# Altium footprint library Zmod.PcbLib: 229 footprints (part 8 of 15)
Each footprint in its own frame and in the unit in brackets; x right, y up, seen from the top. Pads: shape width x height; smd on the part's side, far side on the other; paste and mask are expansions set on the pad; w line width, h text height; cw(c..) or ccw(c..) is an arc to the next point about the centre after c.
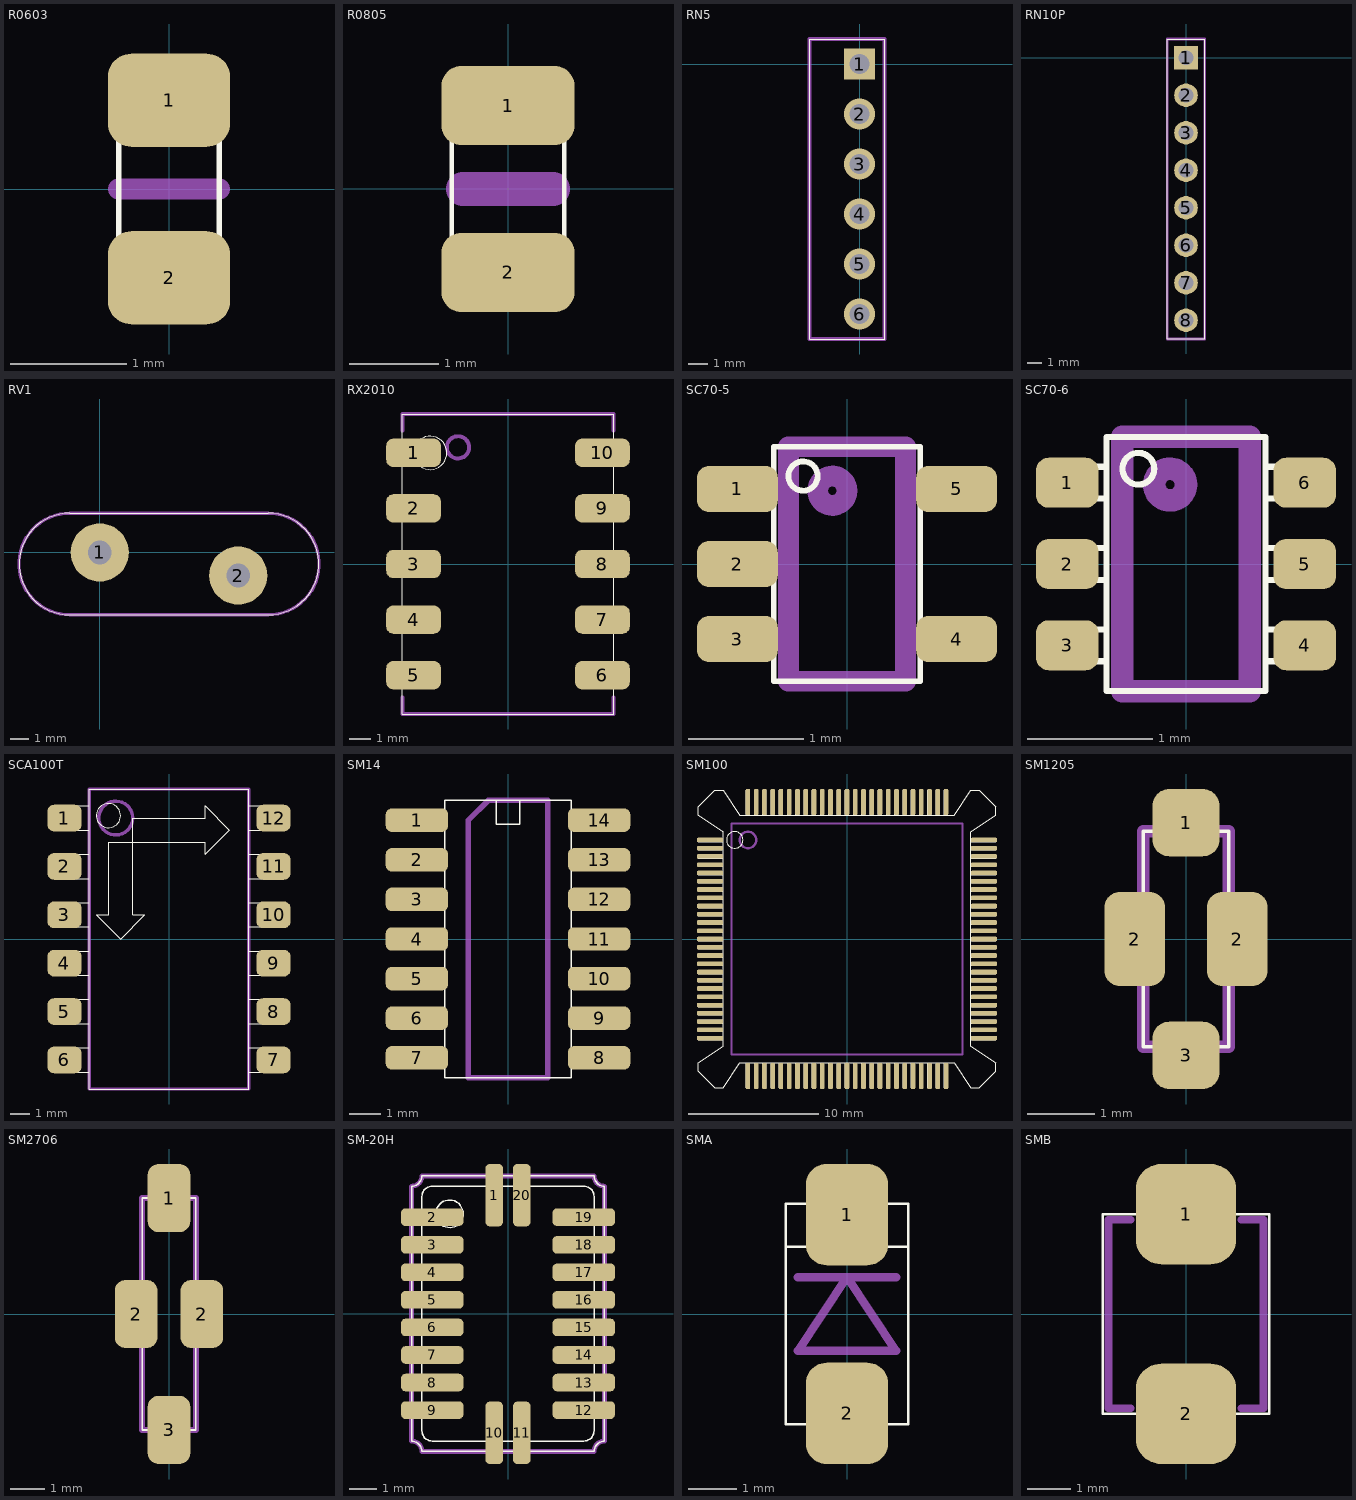
[diagram p7: the footprints below, top view; thin cyan lines are the x and y axes]

## R0603 [mm]
height 0.508
pads (2):
  rrect50% 1.05x0.8 smd: 1(0,0.762) 2(0,-0.762)
Top Overlay:
  lines w0.05: -0.432,-0.787 -0.432,0.787 0.432,0.787 0.432,-0.787 -0.432,-0.787
Mechanical 15:
  lines w0.18: -0.432,0 0.432,0
  text ".Designator" at 0.508,-1.397 h1.5

## R0805 [mm]
pads (2):
  rrect50% 1.5x0.89 smd: 1(0,0.94) 2(0,-0.94)
Top Overlay:
  lines w0.05: -0.635,-1.016 0.635,-1.016 0.635,1.016 -0.635,1.016 -0.635,-1.016
Mechanical 15:
  lines w0.38: -0.508,0 0.508,0
  text ".Designator" at 0.635,-1.905 h1.5

## RN5 [mm]
pads (6):
  rect 1.6x1.6 / inner round 1 / far side rect 1.6x1.6 hole 1: 1(0,0)
  round 1.6 / inner round 1 / far side round 1.6 hole 1: 2(0,-2.54) 3(0,-5.08) 4(0,-7.62) 5(0,-10.16) 6(0,-12.7)
Top Overlay:
  lines w0.05: -2.54,-13.97 -2.54,1.27 1.27,1.27 1.27,-13.97 -2.54,-13.97
Mechanical 15:
  lines w0.18: -2.54,-13.97 -2.54,1.27 1.27,1.27 1.27,-13.97 -2.54,-13.97
  text ".Designator" at -0.762,-14.097 h1.5

## RN10P [mm]
pads (8):
  rect 1.6x1.6 / inner round 1 / far side rect 1.6x1.6 hole 1: 1(0,0)
  round 1.6 / inner round 1 / far side round 1.6 hole 1: 2(0,-2.54) 3(0,-5.08) 4(0,-7.62) 5(0,-10.16) 6(0,-12.7) 7(0,-15.24) 8(0,-17.78)
Top Overlay:
  lines w0.05: -1.27,-19.05 -1.27,1.27 1.27,1.27 1.27,-19.05 -1.27,-19.05
Mechanical 15:
  lines w0.18: -1.27,-19.05 -1.27,1.27 1.27,1.27 1.27,-19.05 -1.27,-19.05
  text ".Designator" at 0.762,-19.05 h1.5

## RV1 [mm]
pads (2):
  round 3.2 / inner round 1.3 / far side round 3.2 hole 1.3: 1(0,0) 2(7.62,-1.27)
Top Overlay:
  lines w0.05: -1.651,-3.429 9.271,-3.429 ; -1.651,2.159 9.271,2.159 ; -1.646,-3.429 cw(c-1.651,-0.635) -1.646,2.159 ; 9.276,-3.429 ccw(c9.271,-0.635) 9.276,2.159
Mechanical 15:
  lines w0.18: -1.651,-3.429 9.271,-3.429 ; -1.651,2.159 9.271,2.159 ; -1.646,-3.429 cw(c-1.651,-0.635) -1.646,2.159 ; 9.276,-3.429 ccw(c9.271,-0.635) 9.276,2.159
  text ".Designator" at -0.889,0.508 h1.5

## RX2010 [mm]
height 2.54
pads (10):
  rrect50% 2.5x1.3 smd paste+0: 1(-4.318,5.08) 2(-4.318,2.54) 3(-4.318,0) 4(-4.318,-2.54) 5(-4.318,-5.08) 6(4.318,-5.08) 7(4.318,-2.54) 8(4.318,0) 9(4.318,2.54) 10(4.318,5.08)
Top Overlay:
  circle w0.05: c-3.556,5.08 r0.762
  lines w0.05: -4.826,-6.858 -4.826,6.858 4.826,6.858 4.826,-6.858 -4.826,-6.858
Mechanical 15:
  circle w0.18: c-2.286,5.334 r0.508
  lines w0.18: -4.826,-6.096 -4.826,-6.858 4.826,-6.858 4.826,-6.096 ; -4.826,6.096 -4.826,6.858 4.826,6.858 4.826,6.096
  text ".Designator" at -1.397,-5.969 h1.5

## SC70-5 [mm] "Rev. 2, pad size was 0.5x0.4mm, round"
height 2.413
pads (5):
  rrect50% 0.7x0.4 smd paste+0: 1(-0.95,0.65) 2(-0.95,0) 3(-0.95,-0.65) 4(0.95,-0.65) 5(0.95,0.65)
Top Overlay:
  circle w0.05: c-0.381,0.762 r0.127
  lines w0.05: -0.635,-0.777 -1.016,-0.777 -1.016,-0.523 -0.635,-0.523 ; -0.635,-0.127 -1.016,-0.127 -1.016,0.127 -0.635,0.127 ; -0.635,0.523 -1.016,0.523 -1.016,0.777 -0.635,0.777 ; 0.635,-0.777 1.016,-0.777 1.016,-0.523 0.635,-0.523 ; 0.635,0.523 1.016,0.523 1.016,0.777 0.635,0.777 ; -0.635,-1.016 -0.635,1.016 0.635,1.016 0.635,-1.016 -0.635,-1.016
Mechanical 15:
  circle w0.18: c-0.127,0.635 r0.127
  lines w0.18: -0.508,-1.016 -0.508,1.016 0.508,1.016 0.508,-1.016 -0.508,-1.016
  text ".Designator" at 0.127,-1.143 h1.5

## SC70-6 [mm]
height 2.413
pads (6):
  rrect50% 0.5x0.4 smd paste+0: 1(-0.95,0.65) 2(-0.95,0) 3(-0.95,-0.65) 4(0.95,-0.65) 5(0.95,0) 6(0.95,0.65)
Top Overlay:
  circle w0.05: c-0.381,0.762 r0.127
  lines w0.05: -0.635,-0.777 -1.016,-0.777 -1.016,-0.523 -0.635,-0.523 ; -0.635,-0.127 -1.016,-0.127 -1.016,0.127 -0.635,0.127 ; -0.635,0.523 -1.016,0.523 -1.016,0.777 -0.635,0.777 ; 0.635,-0.777 1.016,-0.777 1.016,-0.523 0.635,-0.523 ; 0.635,-0.127 1.016,-0.127 1.016,0.127 0.635,0.127 ; 0.635,0.523 1.016,0.523 1.016,0.777 0.635,0.777 ; -0.635,-1.016 0.635,-1.016 0.635,1.016 -0.635,1.016 -0.635,-1.016
Mechanical 15:
  circle w0.18: c-0.127,0.635 r0.127
  lines w0.18: -0.508,-1.016 0.508,-1.016 0.508,1.016 -0.508,1.016 -0.508,-1.016
  text ".Designator" at 0.127,-1.143 h1.5

## SCA100T [mm]
height 5.08
pads (12):
  rrect50% 1.8x1.4 smd paste+0: 1(-5.486,6.35) 2(-5.486,3.81) 3(-5.486,1.27) 4(-5.486,-1.27) 5(-5.486,-3.81) 6(-5.486,-6.35) 7(5.486,-6.35) 8(5.486,-3.81) 9(5.486,-1.27) 10(5.486,1.27) 11(5.486,3.81) 12(5.486,6.35)
Top Overlay:
  circle w0.05: c-3.175,6.477 r0.635
  lines w0.05: -4.953,-6.604 -5.715,-6.604 -5.715,-6.096 -4.953,-6.096 ; -4.953,-4.064 -5.715,-4.064 -5.715,-3.556 -4.953,-3.556 ; -4.953,-1.524 -5.715,-1.524 -5.715,-1.016 -4.953,-1.016 ; -4.953,1.016 -5.715,1.016 -5.715,1.524 -4.953,1.524 ; -4.953,3.556 -5.715,3.556 -5.715,4.064 -4.953,4.064 ; -4.953,6.096 -5.715,6.096 -5.715,6.604 -4.953,6.604 ; -4.191,-6.985 -4.953,-6.985 -4.953,-5.715 -4.191,-5.715 ; -4.191,-4.445 -4.953,-4.445 -4.953,-3.175 -4.191,-3.175 ; -4.191,-1.905 -4.953,-1.905 -4.953,-0.635 -4.191,-0.635 ; -4.191,0.635 -4.953,0.635 -4.953,1.905 -4.191,1.905 ; -4.191,3.175 -4.953,3.175 -4.953,4.445 -4.191,4.445 ; -4.191,5.715 -4.953,5.715 -4.953,6.985 -4.191,6.985 ; 4.191,-6.985 4.953,-6.985 4.953,-5.715 4.191,-5.715 ; 4.191,-4.445 4.953,-4.445 4.953,-3.175 4.191,-3.175 ; 4.191,-1.905 4.953,-1.905 4.953,-0.635 4.191,-0.635 ; 4.191,0.635 4.953,0.635 4.953,1.905 4.191,1.905 ; 4.191,3.175 4.953,3.175 4.953,4.445 4.191,4.445 ; 4.191,5.715 4.953,5.715 4.953,6.985 4.191,6.985 ; 4.953,-6.604 5.715,-6.604 5.715,-6.096 4.953,-6.096 ; 4.953,-4.064 5.715,-4.064 5.715,-3.556 4.953,-3.556 ; 4.953,-1.524 5.715,-1.524 5.715,-1.016 4.953,-1.016 ; 4.953,1.016 5.715,1.016 5.715,1.524 4.953,1.524 ; 4.953,3.556 5.715,3.556 5.715,4.064 4.953,4.064 ; 4.953,6.096 5.715,6.096 5.715,6.604 4.953,6.604 ; -1.905,5.08 -1.905,1.27 -1.27,1.27 -2.54,0 -3.81,1.27 -3.175,1.27 -3.175,5.08 -1.905,5.08 ; -1.905,5.08 -1.905,6.35 1.905,6.35 1.905,6.985 3.175,5.715 1.905,4.445 1.905,5.08 -1.905,5.08 ; -4.191,-7.874 -4.191,7.874 4.191,7.874 4.191,-7.874 -4.191,-7.874
Mechanical 15:
  circle w0.18: c-2.794,6.35 r0.889
  lines w0.18: -4.191,-7.874 -4.191,7.874 4.191,7.874 4.191,-7.874 -4.191,-7.874
  text ".Designator" at -1.524,-7.112 h1.5

## SM14 [mm]
height 1.905
pads (14):
  rrect50% 2x0.75 smd paste+0: 1(-2.921,3.81) 2(-2.921,2.54) 3(-2.921,1.27) 4(-2.921,0) 5(-2.921,-1.27) 6(-2.921,-2.54) 7(-2.921,-3.81) 8(2.921,-3.81) 9(2.921,-2.54) 10(2.921,-1.27) 11(2.921,0) 12(2.921,1.27) 13(2.921,2.54) 14(2.921,3.81)
Top Overlay:
  lines w0.05: -2.032,-4.064 -3.175,-4.064 -3.175,-3.556 -2.032,-3.556 ; -2.032,-2.794 -3.175,-2.794 -3.175,-2.286 -2.032,-2.286 ; -2.032,-1.524 -3.175,-1.524 -3.175,-1.016 -2.032,-1.016 ; -2.032,-0.254 -3.175,-0.254 -3.175,0.254 -2.032,0.254 ; -2.032,1.016 -3.175,1.016 -3.175,1.524 -2.032,1.524 ; -2.032,2.286 -3.175,2.286 -3.175,2.794 -2.032,2.794 ; -2.032,3.556 -3.175,3.556 -3.175,4.064 -2.032,4.064 ; -0.381,4.445 -0.381,3.683 0.381,3.683 0.381,4.445 ; 2.032,-4.064 3.175,-4.064 3.175,-3.556 2.032,-3.556 ; 2.032,-2.794 3.175,-2.794 3.175,-2.286 2.032,-2.286 ; 2.032,-1.524 3.175,-1.524 3.175,-1.016 2.032,-1.016 ; 2.032,-0.254 3.175,-0.254 3.175,0.254 2.032,0.254 ; 2.032,1.016 3.175,1.016 3.175,1.524 2.032,1.524 ; 2.032,2.286 3.175,2.286 3.175,2.794 2.032,2.794 ; 2.032,3.556 3.175,3.556 3.175,4.064 2.032,4.064 ; -2.032,-4.445 -2.032,4.445 2.032,4.445 2.032,-4.445 -2.032,-4.445
Mechanical 15:
  lines w0.18: -1.27,-4.445 1.27,-4.445 1.27,4.445 -0.635,4.445 -1.27,3.81 -1.27,-4.445
  text ".Designator" at -0.762,-4.064 h1.5

## SM100 [mm]
height 2.54
pads (100):
  rrect50% 2x0.35 smd paste+0: 1(-10.541,7.62) 2(-10.541,6.985) 3(-10.541,6.35) 4(-10.541,5.715) 5(-10.541,5.08) 6(-10.541,4.445) 7(-10.541,3.81) 8(-10.541,3.175) 9(-10.541,2.54) 10(-10.541,1.905) 11(-10.541,1.27) 12(-10.541,0.635) 13(-10.541,0) 14(-10.541,-0.635) 15(-10.541,-1.27) 16(-10.541,-1.905) 17(-10.541,-2.54) 18(-10.541,-3.175) 19(-10.541,-3.81) 20(-10.541,-4.445) 21(-10.541,-5.08) 22(-10.541,-5.715) 23(-10.541,-6.35) 24(-10.541,-6.985) 25(-10.541,-7.62) 51(10.541,-7.62) 52(10.541,-6.985) 53(10.541,-6.35) 54(10.541,-5.715) 55(10.541,-5.08) 56(10.541,-4.445) 57(10.541,-3.81) 58(10.541,-3.175) 59(10.541,-2.54) 60(10.541,-1.905) 61(10.541,-1.27) 62(10.541,-0.635) 63(10.541,0) 64(10.541,0.635) 65(10.541,1.27) 66(10.541,1.905) 67(10.541,2.54) 68(10.541,3.175) 69(10.541,3.81) 70(10.541,4.445) 71(10.541,5.08) 72(10.541,5.715) 73(10.541,6.35) 74(10.541,6.985) 75(10.541,7.62)
  rrect50% 0.35x2 smd paste+0: 26(-7.62,-10.541) 27(-6.985,-10.541) 28(-6.35,-10.541) 29(-5.715,-10.541) 30(-5.08,-10.541) 31(-4.445,-10.541) 32(-3.81,-10.541) 33(-3.175,-10.541) 34(-2.54,-10.541) 35(-1.905,-10.541) 36(-1.27,-10.541) 37(-0.635,-10.541) 38(0,-10.541) 39(0.635,-10.541) 40(1.27,-10.541) 41(1.905,-10.541) 42(2.54,-10.541) 43(3.175,-10.541) 44(3.81,-10.541) 45(4.445,-10.541) 46(5.08,-10.541) 47(5.715,-10.541) 48(6.35,-10.541) 49(6.985,-10.541) 50(7.62,-10.541) 76(7.62,10.541) 77(6.985,10.541) 78(6.35,10.541) 79(5.715,10.541) 80(5.08,10.541) 81(4.445,10.541) 82(3.81,10.541) 83(3.175,10.541) 84(2.54,10.541) 85(1.905,10.541) 86(1.27,10.541) 87(0.635,10.541) 88(0,10.541) 89(-0.635,10.541) 90(-1.27,10.541) 91(-1.905,10.541) 92(-2.54,10.541) 93(-3.175,10.541) 94(-3.81,10.541) 95(-4.445,10.541) 96(-5.08,10.541) 97(-5.715,10.541) 98(-6.35,10.541) 99(-6.985,10.541) 100(-7.62,10.541)
Top Overlay:
  drawing of 326 lines, arcs and shapes, not listed
Mechanical 15:
  lines w0.18: -8.89,-8.89 8.89,-8.89 8.89,8.89 -8.89,8.89 -8.89,-8.89 ; -8.255,7.62 ccw(c-7.62,7.62) -6.985,7.62 ccw(c-7.62,7.62) -8.255,7.62
  text ".Designator" at -6.985,4.953 h1.5

## SM1205 [mm]
height 0.762
pads (4):
  rrect50% 1x1 smd: 1(0,1.727) 3(0,-1.727)
  rrect50% 0.9x1.4 smd: 2(-0.762,0) 2(0.762,0)
Top Overlay:
  lines w0.05: -0.635,-1.6 -0.635,1.6 0.635,1.6 0.635,-1.6 -0.635,-1.6
Mechanical 15:
  lines w0.18: -0.508,-1.6 -0.635,-1.6 -0.635,1.6 -0.508,1.6 ; 0.508,-1.6 0.635,-1.6 0.635,1.6 0.508,1.6
  text ".Designator" at 0.127,-2.159 h1.5

## SM2706 [mm]
height 1.626
pads (4):
  rrect50% 1.25x2 smd: 1(0,3.404) 2(-0.965,0) 2(0.965,0) 3(0,-3.404)
Top Overlay:
  lines w0.05: -0.787,-3.404 -0.787,3.404 0.787,3.404 0.787,-3.404 -0.787,-3.404
Mechanical 15:
  lines w0.18: -0.635,-3.404 -0.787,-3.404 -0.787,3.404 -0.635,3.404 ; 0.635,-3.404 0.787,-3.404 0.787,3.404 0.635,3.404
  text ".Designator" at -0.889,-3.683 h1.5

## SM-20H [mm]
height 2.032
pads (20):
  rrect50% 0.65x2.3 smd paste+0: 1(-0.508,4.369) 10(-0.508,-4.394) 11(0.508,-4.394) 20(0.508,4.369)
  rrect50% 2.3x0.65 smd paste+0: 2(-2.794,3.556) 3(-2.794,2.54) 4(-2.794,1.524) 5(-2.794,0.508) 6(-2.794,-0.508) 7(-2.794,-1.524) 8(-2.794,-2.54) 9(-2.794,-3.556) 12(2.794,-3.556) 13(2.794,-2.54) 14(2.794,-1.524) 15(2.794,-0.508) 16(2.794,0.508) 17(2.794,1.524) 18(2.794,2.54) 19(2.794,3.556)
Top Overlay:
  circle w0.05: c-2.159,3.683 r0.508
  lines w0.05: -3.556,-4.699 cw(c-3.556,-5.08) -3.175,-5.08 3.175,-5.08 cw(c3.556,-5.08) 3.556,-4.699 3.556,4.699 cw(c3.556,5.08) 3.175,5.08 -3.175,5.08 cw(c-3.556,5.08) -3.556,4.699 -3.556,-4.699 ; -3.175,-4.318 ccw(c-2.794,-4.318) -2.794,-4.699 2.794,-4.699 ccw(c2.794,-4.318) 3.175,-4.318 3.175,4.318 ccw(c2.794,4.318) 2.794,4.699 -2.794,4.699 ccw(c-2.794,4.318) -3.175,4.318 -3.175,-4.318
Mechanical 15:
  lines w0.18: -3.556,-4.699 cw(c-3.556,-5.08) -3.175,-5.08 3.175,-5.08 cw(c3.556,-5.08) 3.556,-4.699 3.556,4.699 cw(c3.556,5.08) 3.175,5.08 -3.175,5.08 cw(c-3.556,5.08) -3.556,4.699 -3.556,-4.699
  text ".Designator" at -1.143,-3.81 h1.5

## SMA [mm] "Do-214 With Band"
height 2.54
pads (2):
  rrect50% 1.7x2.1 smd: 1(0,2.057) 2(0,-2.057)
Top Overlay:
  lines w0.05: -1.27,1.397 1.27,1.397 ; -0.762,-2.286 -0.762,-2.667 0.762,-2.667 0.762,-2.286 ; -0.762,2.286 -0.762,2.667 0.762,2.667 0.762,2.286 ; -1.27,-2.286 1.27,-2.286 1.27,2.286 -1.27,2.286 -1.27,-2.286
Mechanical 15:
  lines w0.18: -1.016,0.762 1.016,0.762 ; -1.016,-0.762 1.016,-0.762 0,0.762 -1.016,-0.762
  text ".Designator" at 0.762,-2.286 h1.5

## SMB [mm] "DO-214AA Without Band"
height 2.54
pads (2):
  rrect50% 2.3x2.3 smd: 1(0,2.286) 2(0,-2.286)
Top Overlay:
  lines w0.05: -1.016,-2.286 -1.016,-2.794 1.016,-2.794 1.016,-2.286 ; -1.016,2.286 -1.016,2.794 1.016,2.794 1.016,2.286 ; -1.905,-2.286 1.905,-2.286 1.905,2.286 -1.905,2.286 -1.905,-2.286
Mechanical 15:
  lines w0.18: -1.27,-2.159 -1.778,-2.159 -1.778,2.159 -1.27,2.159 ; 1.27,-2.159 1.778,-2.159 1.778,2.159 1.27,2.159
  text ".Designator" at -0.254,-2.159 h1.5